# Altium footprint library THU VIEN PCB.PCBLib: 911 footprints (part 38 of 57)
Each footprint in its own frame and in the unit in brackets; x right, y up, seen from the top. Pads: shape width x height; smd on the part's side, far side on the other; paste and mask are expansions set on the pad; w line width, h text height; cw(c..) or ccw(c..) is an arc to the next point about the centre after c.
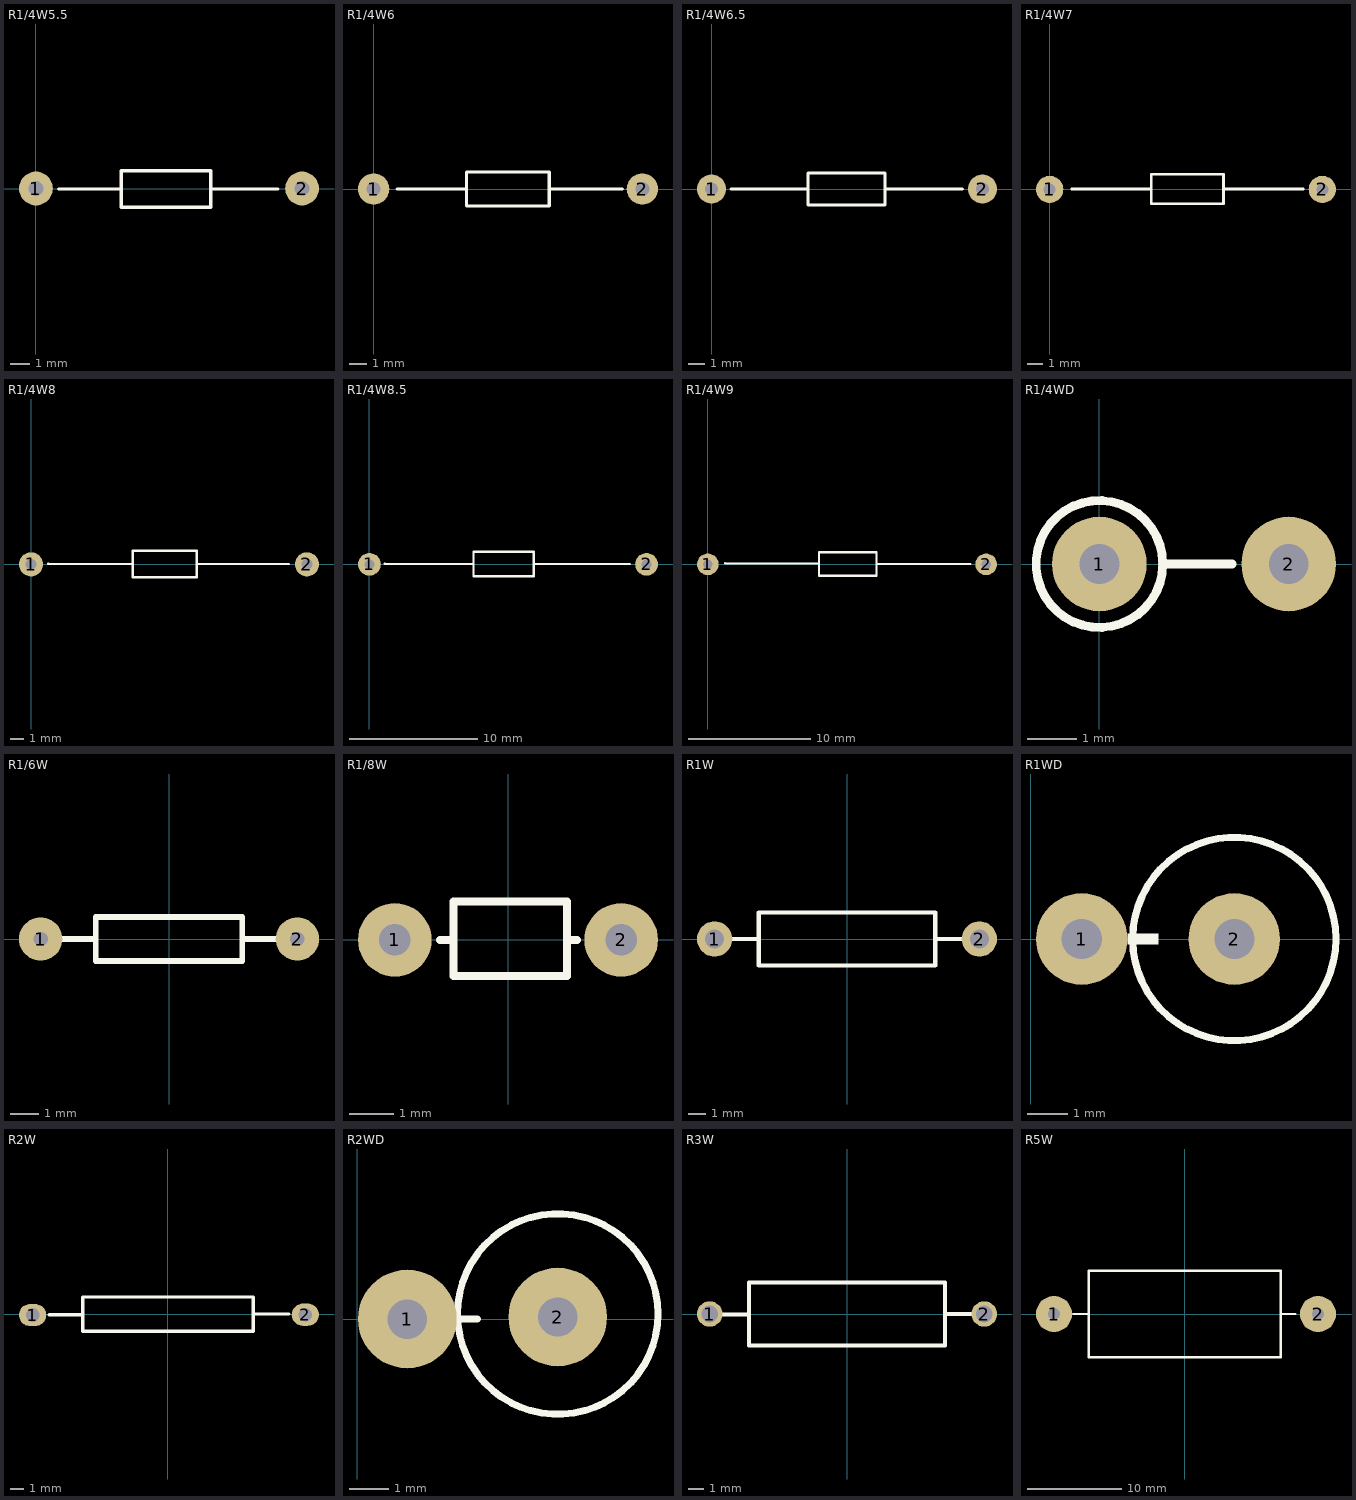
[diagram p37: the footprints below, top view; thin cyan lines are the x and y axes]

## R1/4W5.5 [mil] "R 1/4W, 2 Pin, 550mil"
height 100
pads (2):
  round 70 hole 31: 1(0,0) 2(550,0)
Top Overlay:
  lines w7: 47,-1 176,-1 ; 361,-1 500,-1 ; 176,-39 361,-39 361,37 176,37 176,-39

## R1/4W6 [mil] "R 1/4W, 2 Pin, 600mil"
height 100
pads (2):
  round 70 hole 31: 1(0,0) 2(600,0)
Top Overlay:
  lines w7: 52,0 207,0 ; 392,0 556,0 ; 207,-38 392,-38 392,38 207,38 207,-38

## R1/4W6.5 [mil] "R 1/4W, 2 Pin, 650mil"
height 100
pads (2):
  round 70 hole 31: 1(0,0) 2(650,0)
Top Overlay:
  lines w7: 47,0 231,0 ; 416,0 602,0 ; 231,-38 231,38 416,38 416,-38 231,-38

## R1/4W7 [mil] "R 1/4W, 2 Pin, 600mil"
height 100
pads (2):
  round 70 hole 31: 1(0,0) 2(700,0)
Top Overlay:
  lines w7: 57,1 261,1 ; 446,1 651,1 ; 261,-37 446,-37 446,39 261,39 261,-37
3D body "SW3dPS-Resistor 5-band.STEP": height 142, standoff -125, extent 4.25,-65 705.75,67

## R1/4W8 [mil] "R 1/4W, 2 Pin, 600mil"
height 100
pads (2):
  round 70 hole 31: 1(0,0) 2(800,0)
Top Overlay:
  lines w7: 50,2 295,1 ; 480,1 748,1 ; 295,-37 480,-37 480,39 295,39 295,-37

## R1/4W8.5 [mil] "R 1/4W, 2 Pin, 600mil"
height 100
pads (2):
  round 70 hole 31: 1(0,0) 2(850,0)
Top Overlay:
  lines w7: 47,2.11 319,1 ; 504,1 799,1 ; 319,-37 319,39 504,39 504,-37 319,-37

## R1/4W9 [mil] "R 1/4W, 2 Pin, 600mil"
height 100
pads (2):
  round 70 hole 31: 1(0,0) 2(900,0)
Top Overlay:
  lines w7: 56.01,3.24 360,2 ; 545,1 849,1 ; 360,-37 360,39 545,39 545,-37 360,-37

## R1/4WD [mm] "R 1/4W, 2 Pin, 150mil"
height 2.54
pads (2):
  round 1.905 hole 0.8: 1(0,0) 2(3.81,0)
Top Overlay:
  circle w0.178: c0,0 r1.276
  lines w0.178: 1.27,0 2.667,0
3D body "SW3DPS-0_5W METAL FILM RESISTOR-DEFAULT.STEP": height 13.42, standoff -4.28, extent -1.778,-1.7 4.322,1.7

## R1/6W [mm]
height 1.524
pads (2):
  round 1.5 hole 0.5: 1(-4.445,0) 2(4.445,0)
Top Overlay:
  lines w0.2: -3.81,0 -2.54,0 ; 3.81,0 2.54,0 ; 2.54,0 2.54,-0.762 -2.54,-0.762 -2.54,0.762 2.54,0.762 2.54,0

## R1/8W [mil] "R 1/8W, 2 pin, 300mil"
height 100
pads (2):
  round 65 hole 28: 1(-100,0) 2(100,0)
Top Overlay:
  lines w7: -60,0 -48,0 ; 54,0 61,0 ; -48,-32 52,-32 52,34 -48,34 -48,-32
3D body "SW3dPS-Res_Normal (0.25W).STEP": height 86.31, standoff -68.11, extent -135,-35.48 135,37

## R1W [mil] "dien tro 1W"
pads (2):
  round 80 hole 43.31: 1(-300,0) 2(300,0)
Top Overlay:
  lines w10: -300,0 -200,0 ; 200,0 300,0 ; -200,-60 200,-60 200,60 -200,60 -200,-60

## R1WD [mil] "R 1W, 2 pin, 500mil"
height 100
pads (2):
  round 90 hole 39.37: 1(50,0) 2(200,0)
Top Overlay:
  circle w7: c200,0 r100
  region: 125,5 125,-5 95,-5 95,5

## R2W [mil] "dien tro 2W"
height 10
pads (2):
  oval 80x65 hole 40: 1(-397,-3) 2(403,-2)
Top Overlay:
  lines w10: -349,-2 -250,-2 -250,-50 250,-50 250,50 -250,50 -250,0 -251,-1 ; 250,0 354,0
3D body "RES-2W.STEP": height 216.54, standoff -118.11, extent -413.78,-110 413.78,106.54

## R2WD [mm] "R2W, 2 pin, 700mil"
height 5.08
pads (2):
  round 2.5 hole 1: 1(1.27,0) 2(5.08,0.051)
Top Overlay:
  circle w0.178: c5.08,0.127 r2.54
  lines w0.178: 2.159,0 3.048,0

## R3W [mil] "dien tro 3W"
pads (2):
  round 65 hole 43.31: 1(-350,0) 2(350,0)
Top Overlay:
  lines w10: -321,-1 -250,-1 -250,-80 250,-80 250,80 -250,80 -250,0 -251,-1 ; 250,0 320,0

## R5W [mil] "dien tro 5W"
pads (2):
  round 150 hole 50: 1(-545,0) 2(555,0)
Top Overlay:
  lines w10: -465,0 -400,0 ; 400,0 460,0 ; -400,-180 -400,180 400,180 400,-180 -400,-180
3D body "Tro 5W.step": height 354.93, standoff -141.13, extent -559.53,-191.85 570,201.85